# Altium footprint library Elettronica FM.PcbLib: 387 footprints (part 22 of 25)
Each footprint in its own frame and in the unit in brackets; x right, y up, seen from the top. Pads: shape width x height; smd on the part's side, far side on the other; paste and mask are expansions set on the pad; w line width, h text height; cw(c..) or ccw(c..) is an arc to the next point about the centre after c.
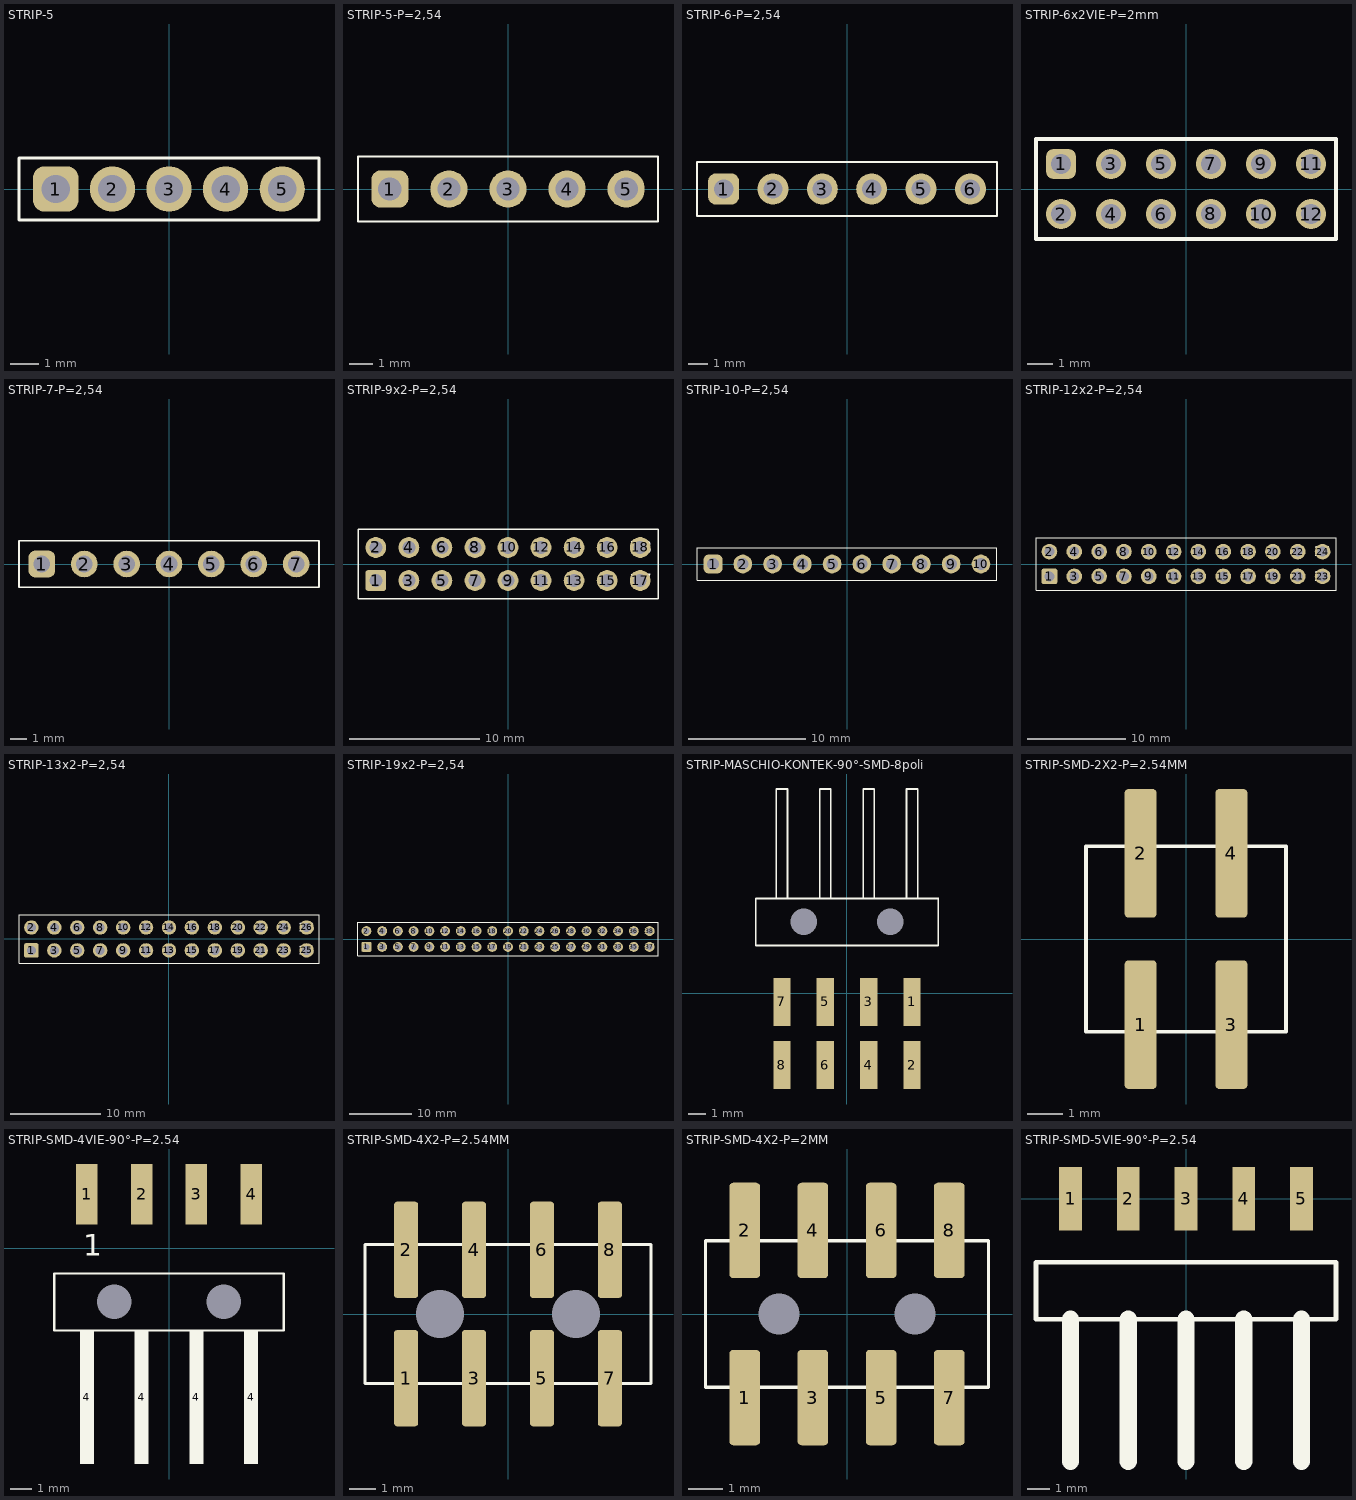
[diagram p21: the footprints below, top view; thin cyan lines are the x and y axes]

## STRIP-5 [mm]
pads (5):
  rrect50% 1.6x1.6 hole 1: 1(-4,0)
  round 1.6 hole 1: 2(-2,0) 3(0,0) 4(2,0) 5(4,0)
Top Overlay:
  lines w0.1: -5.3,-1.1 -5.3,1.1 5.3,1.1 5.3,-1.1 -5.3,-1.1

## STRIP-5-P=2,54 [mm]
pads (5):
  rrect50% 1.6x1.6 hole 1: 1(-5.08,0)
  round 1.6 hole 1: 2(-2.54,0) 3(0,0) 4(2.54,0) 5(5.08,0)
Top Overlay:
  lines w0.1: -6.45,-1.4 -6.45,1.4 6.45,1.4 6.45,-1.4 -6.45,-1.4
  text "1" at -5.225,-0.475 h1

## STRIP-6-P=2,54 [mm]
pads (6):
  rrect50% 1.6x1.6 hole 1: 1(-6.35,0)
  round 1.6 hole 1: 2(-3.81,0) 3(-1.27,0) 4(1.27,0) 5(3.81,0) 6(6.35,0)
Top Overlay:
  lines w0.1: -7.72,-1.4 7.72,-1.4 7.72,1.4 -7.72,1.4 -7.72,-1.4
  text "1" at -6.495,-0.475 h1

## STRIP-6x2VIE-P=2mm [mm]
height 1.7
pads (12):
  rrect50% 1.2x1.2 hole 0.8: 1(-5,1)
  round 1.2 hole 0.8: 2(-5,-1) 3(-3,1) 4(-3,-1) 5(-1,1) 6(-1,-1) 7(1,1) 8(1,-1) 9(3,1) 10(3,-1) 11(5,1) 12(5,-1)
Top Overlay:
  lines w0.15: -6,-2 6,-2 6,2 -6,2 -6,-2
3D body: height 8.7, standoff -2.8, extent 4.75,0.75 5.25,1.25
3D body: height 8.7, standoff -2.8, extent 2.75,0.75 3.25,1.25
3D body: height 8.7, standoff -2.8, extent 0.75,0.75 1.25,1.25
3D body: height 8.7, standoff -2.8, extent -1.25,0.75 -0.75,1.25
3D body: height 8.7, standoff -2.8, extent -3.25,0.75 -2.75,1.25
3D body: height 8.7, standoff -2.8, extent -5.25,0.75 -4.75,1.25
3D body: height 2, standoff 0, extent -6,-2 6,2
3D body: height 8.7, standoff -2.8, extent -5.25,-1.25 -4.75,-0.75
3D body: height 8.7, standoff -2.8, extent -3.25,-1.25 -2.75,-0.75
3D body: height 8.7, standoff -2.8, extent -1.25,-1.25 -0.75,-0.75
3D body: height 8.7, standoff -2.8, extent 0.75,-1.25 1.25,-0.75
3D body: height 8.7, standoff -2.8, extent 2.75,-1.25 3.25,-0.75
3D body: height 8.7, standoff -2.8, extent 4.75,-1.25 5.25,-0.75

## STRIP-7-P=2,54 [mm]
pads (7):
  rrect50% 1.6x1.6 hole 1: 1(-7.62,0)
  round 1.6 hole 1: 2(-5.08,0) 3(-2.54,0) 4(0,0) 5(2.54,0) 6(5.08,0) 7(7.62,0)
Top Overlay:
  lines w0.1: -8.99,-1.4 -8.99,1.4 8.99,1.4 8.99,-1.4 -8.99,-1.4
  text "1" at -7.765,-0.475 h1

## STRIP-9x2-P=2,54 [mm]
pads (18):
  rrect25% 1.6x1.6 hole 1: 1(-10.16,-1.27)
  round 1.6 hole 1: 2(-10.16,1.27) 3(-7.62,-1.27) 4(-7.62,1.27) 5(-5.08,-1.27) 6(-5.08,1.27) 7(-2.54,-1.27) 8(-2.54,1.27) 9(0,-1.27) 10(0,1.27) 11(2.54,-1.27) 12(2.54,1.27) 13(5.08,-1.27) 14(5.08,1.27) 15(7.62,-1.27) 16(7.62,1.27) 17(10.16,-1.27) 18(10.16,1.27)
Top Overlay:
  lines w0.1: -11.53,-2.675 11.53,-2.675 11.53,2.675 -11.53,2.675 -11.53,-2.675
  text "1" at -10.305,-1.745 h1
  text "2" at -10.495,0.8 h1
  text "17" at 9.32,-1.75 h1
  text "18" at 9.32,0.8 h1

## STRIP-10-P=2,54 [mm]
pads (10):
  rrect50% 1.6x1.6 hole 1: 1(-11.43,0)
  round 1.6 hole 1: 2(-8.89,0) 3(-6.35,0) 4(-3.81,0) 5(-1.27,0) 6(1.27,0) 7(3.81,0) 8(6.35,0) 9(8.89,0) 10(11.43,0)
Top Overlay:
  lines w0.1: -12.8,-1.4 -12.8,1.4 12.8,1.4 12.8,-1.4 -12.8,-1.4
  text "1" at -11.575,-0.475 h1

## STRIP-12x2-P=2,54 [mm]
pads (24):
  rrect25% 1.6x1.6 hole 1: 1(-13.97,-1.27)
  round 1.6 hole 1: 2(-13.97,1.27) 3(-11.43,-1.27) 4(-11.43,1.27) 5(-8.89,-1.27) 6(-8.89,1.27) 7(-6.35,-1.27) 8(-6.35,1.27) 9(-3.81,-1.27) 10(-3.81,1.27) 11(-1.27,-1.27) 12(-1.27,1.27) 13(1.27,-1.27) 14(1.27,1.27) 15(3.81,-1.27) 16(3.81,1.27) 17(6.35,-1.27) 18(6.35,1.27) 19(8.89,-1.27) 20(8.89,1.27) 21(11.43,-1.27) 22(11.43,1.27) 23(13.97,-1.27) 24(13.97,1.27)
Top Overlay:
  lines w0.1: -15.35,-2.675 -15.35,2.675 15.35,2.675 15.35,-2.675 -15.35,-2.675
  text "2" at -14.305,0.8 h1
  text "1" at -14.115,-1.745 h1
  text "24" at 13.13,0.8 h1
  text "23" at 13.13,-1.75 h1

## STRIP-13x2-P=2,54 [mm]
pads (26):
  rrect25% 1.6x1.6 hole 1: 1(-15.24,-1.27)
  round 1.6 hole 1: 2(-15.24,1.27) 3(-12.7,-1.27) 4(-12.7,1.27) 5(-10.16,-1.27) 6(-10.16,1.27) 7(-7.62,-1.27) 8(-7.62,1.27) 9(-5.08,-1.27) 10(-5.08,1.27) 11(-2.54,-1.27) 12(-2.54,1.27) 13(0,-1.27) 14(0,1.27) 15(2.54,-1.27) 16(2.54,1.27) 17(5.08,-1.27) 18(5.08,1.27) 19(7.62,-1.27) 20(7.62,1.27) 21(10.16,-1.27) 22(10.16,1.27) 23(12.7,-1.27) 24(12.7,1.27) 25(15.24,-1.27) 26(15.24,1.27)
Top Overlay:
  lines w0.1: -16.61,-2.68 16.615,-2.68 16.615,2.67 -16.61,2.67 -16.61,-2.68
  text "26" at 14.4,0.8 h1
  text "25" at 14.4,-1.75 h1
  text "1" at -15.385,-1.745 h1
  text "2" at -15.575,0.8 h1

## STRIP-19x2-P=2,54 [mm]
pads (38):
  rrect25% 1.6x1.6 hole 1: 1(-22.86,-1.27)
  round 1.6 hole 1: 2(-22.86,1.27) 3(-20.32,-1.27) 4(-20.32,1.27) 5(-17.78,-1.27) 6(-17.78,1.27) 7(-15.24,-1.27) 8(-15.24,1.27) 9(-12.7,-1.27) 10(-12.7,1.27) 11(-10.16,-1.27) 12(-10.16,1.27) 13(-7.62,-1.27) 14(-7.62,1.27) 15(-5.08,-1.27) 16(-5.08,1.27) 17(-2.54,-1.27) 18(-2.54,1.27) 19(0,-1.27) 20(0,1.27) 21(2.54,-1.27) 22(2.54,1.27) 23(5.08,-1.27) 24(5.08,1.27) 25(7.62,-1.27) 26(7.62,1.27) 27(10.16,-1.27) 28(10.16,1.27) 29(12.7,-1.27) 30(12.7,1.27) 31(15.24,-1.27) 32(15.24,1.27) 33(17.78,-1.27) 34(17.78,1.27) 35(20.32,-1.27) 36(20.32,1.27) 37(22.86,-1.27) 38(22.86,1.27)
Top Overlay:
  lines w0.1: -24.225,-2.675 24.225,-2.675 24.225,2.675 -24.225,2.675 -24.225,-2.675
  text "37" at 22.02,-1.75 h1
  text "38" at 22.02,0.8 h1
  text "1" at -23.005,-1.745 h1
  text "2" at -23.195,0.8 h1

## STRIP-MASCHIO-KONTEK-90°-SMD-8poli [mm]
pads (10):
  round 0 hole 1.55: 0(-2.54,4.188) 0(2.54,4.188)
  rect 1x2.8 smd mask+0.075: 1(3.81,-0.487) 2(3.81,-4.187) 3(1.27,-0.487) 4(1.27,-4.187) 5(-1.27,-0.487) 6(-1.27,-4.187) 7(-3.81,-0.487) 8(-3.81,-4.187)
Top Overlay:
  lines w0.1: -4.135,5.562 -4.135,11.962 -3.485,11.962 -3.485,5.562 ; -1.595,5.562 -1.595,11.962 -0.945,11.962 -0.945,5.562 ; 0.945,5.562 0.945,11.962 1.595,11.962 1.595,5.562 ; 3.485,5.562 3.485,11.962 4.135,11.962 4.135,5.562 ; 5.34,2.813 5.34,5.562 ; 5.34,2.812 5.34,2.813 ; 5.34,2.812 -5.34,2.812 -5.34,5.562 5.34,5.562 ; 5.34,5.562 5.34,5.562
3D body: height 0, standoff -1.4, extent 1.865,3.513 3.215,4.862
3D body: height 4.1, standoff 3.45, extent -4.135,5.562 -3.485,11.962
3D body: height 1.55, standoff 0.9, extent -4.135,5.562 -3.485,11.962
3D body: height 4.1, standoff 3.45, extent -1.595,5.562 -0.945,11.962
3D body: height 1.55, standoff 0.9, extent -1.595,5.562 -0.945,11.962
3D body: height 4.1, standoff 3.45, extent 0.945,5.562 1.595,11.962
3D body: height 1.55, standoff 0.9, extent 0.945,5.562 1.595,11.962
3D body: height 4.1, standoff 3.45, extent 3.485,5.562 4.135,11.962
3D body: height 1.55, standoff 0.9, extent 3.485,5.562 4.135,11.962
3D body: height 5, standoff 0, extent -5.34,2.812 5.34,5.562
3D body: height 0, standoff -1.4, extent -3.215,3.513 -1.865,4.862

## STRIP-SMD-2X2-P=2.54MM [mm]
height 16.6
pads (4):
  rrect25% 0.9x3.6 smd: 1(-1.27,-2.4) 2(-1.27,2.4) 3(1.27,-2.4) 4(1.27,2.4)
Top Overlay:
  lines w0.1: -2.8,-2.6 -2.8,2.6 2.8,2.6 2.8,-2.6 -2.8,-2.6
  text "3" at 1.455,-1.075 h0.4
  text "4" at 1.455,0.95 h0.4
  text "2" at -1.085,0.95 h0.4
  text "1" at -1.085,-1.075 h0.4
3D body: height 3.55, standoff 1, extent -2.8,-2.6 2.8,2.6

## STRIP-SMD-4VIE-90°-P=2.54 [mm]
height 16.6
pads (10):
  round 0 hole 1.6 unplated mask+0.1: 0(-2.54,-2.5) 0(2.54,-2.5)
  rect 1x2.8 smd: 1(-3.81,2.5) 2(-1.27,2.5) 3(1.27,2.5) 4(3.81,2.5)
  rect 0.65x6.2 on Top Overlay mask+0.1: 4(-3.81,-6.925) 4(-1.27,-6.925) 4(1.27,-6.925) 4(3.81,-6.925)
Top Overlay:
  lines w0.1: -5.325,-3.825 5.325,-3.825 5.325,-1.175 -5.325,-1.175 -5.325,-3.825
  text "1" at -3.975,-0.35 h1

## STRIP-SMD-4X2-P=2.54MM [mm]
height 16.6
pads (10):
  round 0 hole 1.8: 0(-2.54,0) 0(2.54,0)
  rrect25% 0.9x3.6 smd: 1(-3.81,-2.4) 2(-3.81,2.4) 3(-1.27,-2.4) 4(-1.27,2.4) 5(1.27,-2.4) 6(1.27,2.4) 7(3.81,-2.4) 8(3.81,2.4)
Top Overlay:
  lines w0.1: -5.35,-2.6 5.35,-2.6 5.35,2.6 -5.35,2.6 -5.35,-2.6
  text "1" at -3.625,-1.075 h0.4
  text "2" at -3.625,0.95 h0.4
  text "4" at -1.085,0.95 h0.4
  text "6" at 1.455,0.95 h0.4
  text "8" at 3.995,0.95 h0.4
  text "3" at -1.085,-1.075 h0.4
  text "5" at 1.455,-1.075 h0.4
  text "7" at 3.995,-1.075 h0.4
3D body: height 3.55, standoff 1, extent -5.35,-2.6 5.35,2.6

## STRIP-SMD-4X2-P=2MM [mm]
height 16.6
pads (10):
  round 0 hole 1.2: 0(-2,0) 0(2,0)
  rrect25% 0.9x2.8 smd: 1(-3,-2.45) 2(-3,2.45) 3(-1,-2.45) 4(-1,2.45) 5(1,-2.45) 6(1,2.45) 7(3,-2.45) 8(3,2.45)
Top Overlay:
  lines w0.1: -4.15,-2.15 4.15,-2.15 4.15,2.15 -4.15,2.15 -4.15,-2.15
  text "1" at -3.2,-1.55 h0.4
  text "3" at -1.2,-1.475 h0.4
  text "5" at 0.8,-1.475 h0.4
  text "7" at 2.8,-1.475 h0.4
  text "2" at -3.2,1.775 h0.4
  text "4" at -1.2,1.75 h0.4
  text "6" at 0.8,1.75 h0.4
  text "8" at 2.8,1.75 h0.4
3D body: height 4.3, standoff 0.3, extent -4.15,-2.15 4.15,2.15

## STRIP-SMD-5VIE-90°-P=2.54 [mm]
height 16.6
pads (5):
  rect 1x2.8 smd: 1(-5.08,0) 2(-2.54,0) 3(0,0) 4(2.54,0) 5(5.08,0)
Top Overlay:
  lines w0.2: -6.6,-5.3 6.6,-5.3 6.6,-2.8 -6.6,-2.8 -6.6,-5.3
  lines w0.762: -5.08,-11.55 -5.08,-5.3 ; -2.54,-11.55 -2.54,-5.3 ; 0,-11.55 0,-5.3 ; 2.54,-11.55 2.54,-5.3 ; 5.08,-11.55 5.08,-5.3